# Altium footprint library mfmc_footprints.PcbLib: 156 footprints (part 5 of 10)
Each footprint in its own frame and in the unit in brackets; x right, y up, seen from the top. Pads: shape width x height; smd on the part's side, far side on the other; paste and mask are expansions set on the pad; w line width, h text height; cw(c..) or ccw(c..) is an arc to the next point about the centre after c.
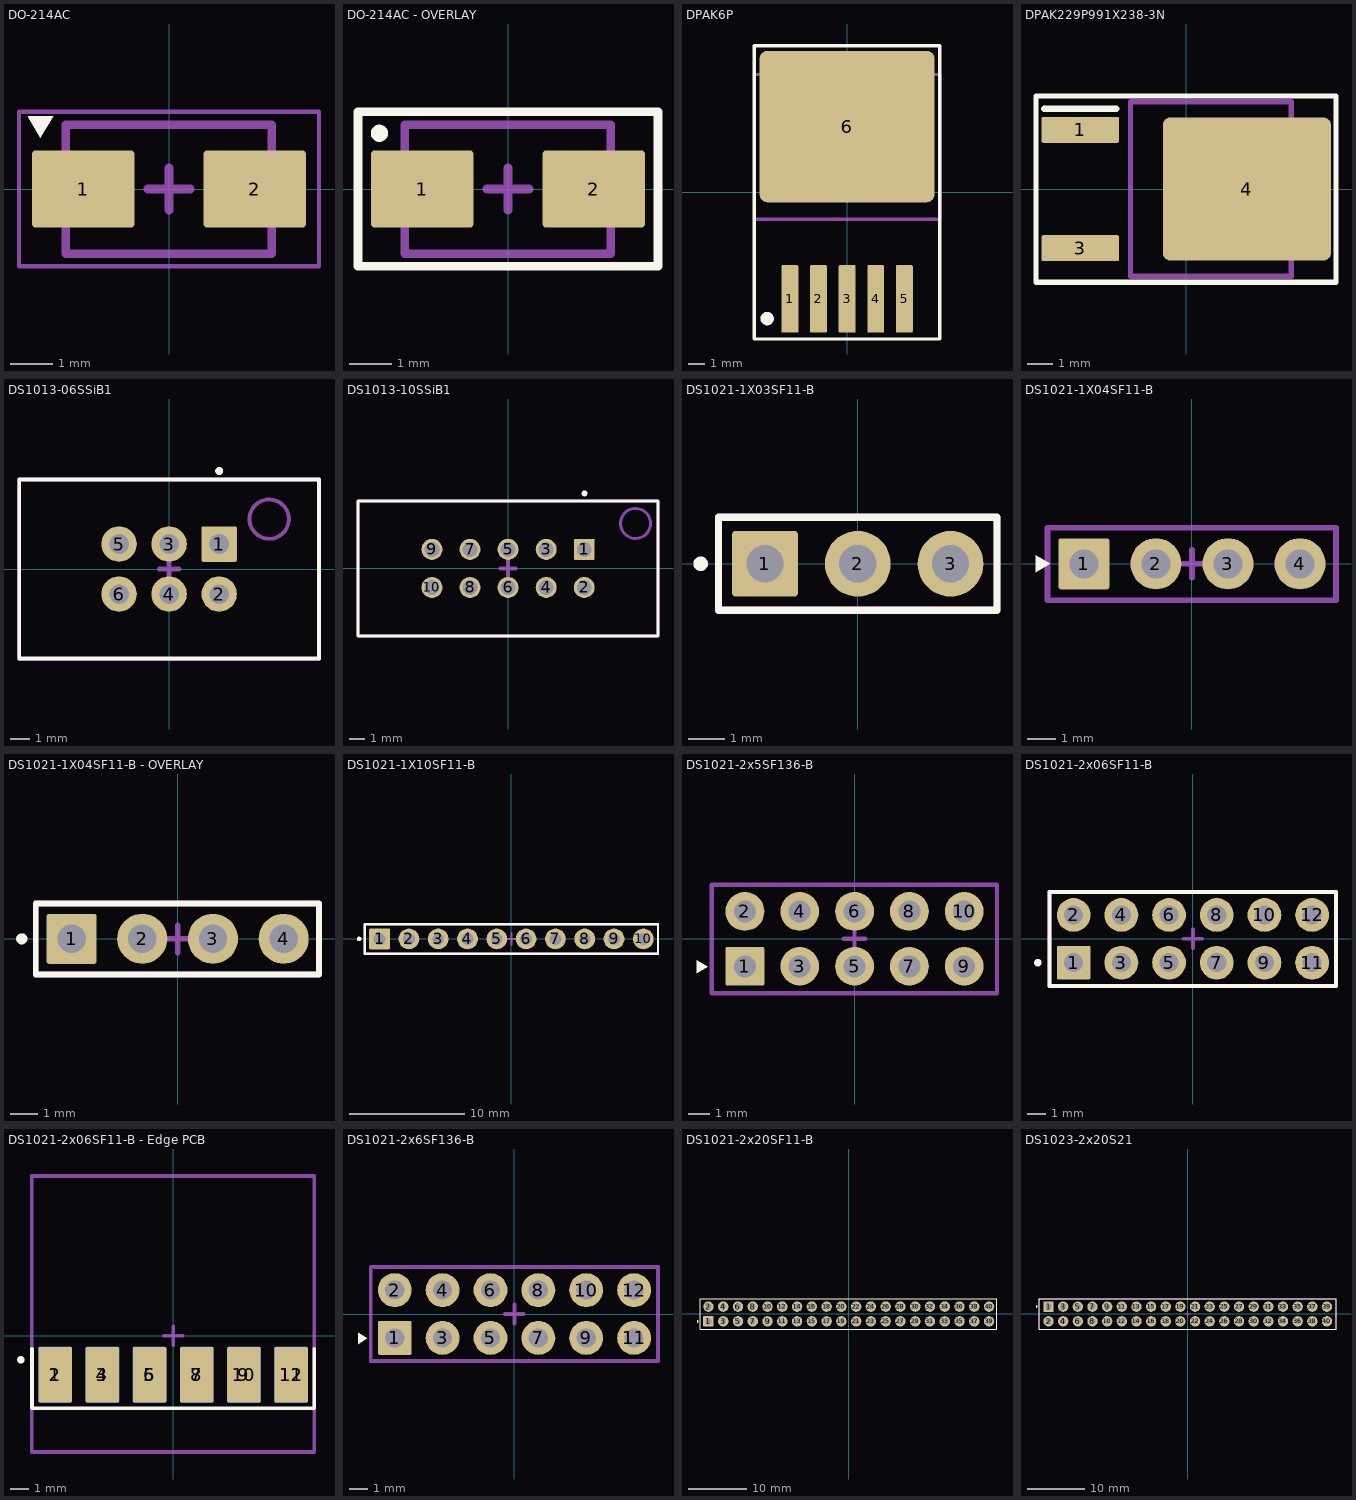
[diagram p4: the footprints below, top view; thin cyan lines are the x and y axes]

## DO-214AC [mm]
height 2.3
pads (2):
  rrect10% 2.4x1.8 smd: 1(-2,0) 2(2,0)
Top Overlay:
  region: -3.3,1.7 -3,1.2 -2.7,1.7
Top Courtyard:
  lines w0.1: -3.5,-1.8 3.5,-1.8 3.5,1.8 -3.5,1.8 -3.5,-1.8
  lines w0.2: -0.5,0 0.5,0 ; 0,-0.5 0,0.5
Top Assembly:
  circle w0.2: c-1.8,0 r0.1
  lines w0.2: -2.413,-1.513 2.4,-1.513 2.4,1.5 -2.413,1.5 -2.413,-1.513
Top Designator (Mech10):
  text ".Designator" at -7.618,-0.508 h1.52
3D body "User Library-DO-214AC SMA.STEP": height 2.42, standoff 0.01, extent -2.6,-1.3 2.6,1.3

## DO-214AC - OVERLAY [mm]
height 2.3
pads (2):
  rrect10% 2.4x1.8 smd: 1(-2,0) 2(2,0)
Top Overlay:
  circle w0.2: c-3,1.3 r0.1
  lines w0.2: -3.5,-1.8 -3.5,1.8 3.5,1.8 3.5,-1.8 -3.5,-1.8
Top Courtyard:
  lines w0.1: -3.5,-1.8 -3.5,1.8 3.5,1.8 3.5,-1.8 -3.5,-1.8
  lines w0.2: -0.5,0 0.5,0 ; 0,-0.5 0,0.5
Top Assembly:
  circle w0.2: c-1.8,0 r0.1
  lines w0.2: -2.413,-1.513 -2.413,1.5 2.4,1.5 2.4,-1.513 -2.413,-1.513
Top Designator (Mech10):
  text ".Designator" at -7.618,-0.508 h1.52
3D body "User Library-DO-214AC SMA.STEP": height 2.42, standoff 0.01, extent -2.6,-1.3 2.6,1.3

## DPAK6P [mm]
height 5
pads (6):
  rrect10% 1x4 smd: 1(-3.4,-6.33) 2(-1.7,-6.33) 3(0,-6.33) 4(1.7,-6.33) 5(3.4,-6.33)
  rrect10% 10.4x9 smd: 6(0,3.91)
Top Overlay:
  circle w0.4: c-4.75,-7.5 r0.2
  lines w0.2: -5.513,-8.713 5.5,-8.713 5.5,8.7 -5.513,8.7 -5.513,-8.713
Top Courtyard:
  lines w0.1: -5.5,-8.7 5.5,-8.7 5.5,8.7 -5.5,8.7 -5.5,-8.7
  lines w0.2: -0.5,0 0.5,0 ; 0,-0.5 0,0.5
Top Assembly:
  lines w0.2: -5.5,-1.6 5.5,-1.6 5.5,7 -5.5,7 -5.5,-1.6
Top Designator (Mech10):
  text ".Designator" at -7.624,-0.514 h1.52
3D body "LM2576-5.0WU.STEP": height 4.83, standoff -0.25, extent -5.08,-7.51 5.08,7.4

## DPAK229P991X238-3N [mm] "D-PAK, 3-Pads, Body 6,21x6,73mm (max), IPC Medium Density"
height 2.38
pads (3):
  rrect10% 3x1 smd: 1(-4.1,2.29) 3(-4.1,-2.29)
  rrect10% 6.5x5.55 smd: 4(2.35,0)
Top Overlay:
  lines w0.2: -5.813,-3.613 5.8,-3.613 5.8,3.6 -5.813,3.6 -5.813,-3.613
  lines w0.254: -5.5,3.1 -2.7,3.1
Top Courtyard:
  lines w0.1: -5.8,-3.6 -5.8,3.6 5.8,3.6 5.8,-3.6 -5.8,-3.6
  lines w0.2: -0.5,0 0.5,0 ; 0,-0.5 0,0.5
Top Assembly:
  lines w0.2: -2.15,-3.375 4.07,-3.375 4.07,3.375 -2.15,3.375 -2.15,-3.375
Top Designator (Mech10):
  text ".Designator" at -7.624,-0.514 h1.52
3D body "DPAK229P991X238-3N.step": height 2.38, standoff 0, extent -4.39,-3.375 5.515,3.375

## DS1013-06SSiB1 [mm] "2.54mm Box Header V/T,R/A & SMT Type"
height 9.1
pads (6):
  rrect10% 1.8x1.8 hole 1: 1(2.54,1.27)
  round 1.8 hole 1: 2(2.54,-1.27) 3(0,1.27) 4(0,-1.27) 5(-2.54,1.27) 6(-2.54,-1.27)
Top Overlay:
  circle w0.2: c2.54,4.98 r0.1
  lines w0.2: -7.61,-4.55 7.61,-4.55 7.61,4.55 -7.61,4.55 -7.61,-4.55
Top Courtyard:
  lines w0.1: -7.61,-4.55 7.61,-4.55 7.61,4.55 -7.61,4.55 -7.61,-4.55
  lines w0.254: -0.5,0 0.5,0 ; 0,-0.5 0,0.5
Top Assembly:
  circle w0.2: c5.08,2.54 r1
  lines w0.2: -7.623,-4.563 7.61,-4.563 7.61,4.55 -7.623,4.55 -7.623,-4.563
Top Designator (Mech10):
  text ".Designator" at -7.624,-0.249 h1.52
3D body "DS1013-06.STEP": height 8.9, standoff -3.1, extent -7.61,-4.5 7.61,4.5

## DS1013-10SSiB1 [mm] "2.54mm Box Header V/T,R/A & SMT Type"
height 9.1
pads (10):
  rrect10% 1.4x1.4 hole 1: 1(5.08,1.27)
  round 1.4 hole 1: 2(5.08,-1.27) 3(2.54,1.27) 4(2.54,-1.27) 5(0,1.27) 6(0,-1.27) 7(-2.54,1.27) 8(-2.54,-1.27) 9(-5.08,1.27) 10(-5.08,-1.27)
Top Overlay:
  circle w0.2: c5.1,5 r0.1
  lines w0.2: -10.013,-4.513 10,-4.513 10,4.5 -10.013,4.5 -10.013,-4.513
Top Courtyard:
  lines w0.1: -10.013,-4.513 10,-4.513 10,4.5 -10.013,4.5 -10.013,-4.513
  lines w0.254: -0.5,0 0.5,0 ; 0,-0.5 0,0.5
Top Assembly:
  circle w0.2: c8.5,3 r1
  lines w0.2: -10.013,-4.513 10,-4.513 10,4.5 -10.013,4.5 -10.013,-4.513
Top Designator (Mech10):
  text ".Designator" at -7.618,-0.214 h1.52
3D body "DS1013.STEP": height 8.9, standoff -3.1, extent -10.15,-4.5 10.15,4.5

## DS1021-1X03SF11-B [mm] "2.54mm Pin Header V/T Type"
height 8.6
pads (3):
  rrect10% 1.8x1.8 hole 1.02: 1(-2.54,0)
  round 1.8 hole 1.02: 2(0,0) 3(2.54,0)
Top Overlay:
  circle w0.2: c-4.3,0 r0.1
  lines w0.2: -3.81,-1.27 3.81,-1.27 3.81,1.27 -3.81,1.27 -3.81,-1.27
Top Courtyard:
  lines w0.1: -3.823,-1.283 3.81,-1.283 3.81,1.27 -3.823,1.27 -3.823,-1.283
  lines w0.2: -0.495,0 0.495,0 ; 0,-0.495 0,0.495
Top Assembly:
  circle w0.2: c-2.54,0 r0.5
  lines w0.2: -3.81,-1.27 3.81,-1.27 3.81,1.27 -3.81,1.27 -3.81,-1.27
Top Designator (Mech10):
  text ".Designator" at -7.913,-0.508 h1.52
3D body "DS1021-1X03.STEP": height 8.6, standoff -3, extent -3.81,-1.27 3.81,1.27

## DS1021-1X04SF11-B [mm] "2.54mm Pin Header V/T Type"
height 8.6
pads (4):
  rrect10% 1.8x1.8 hole 1.02: 1(-3.81,0)
  round 1.8 hole 1.02: 2(-1.27,0) 3(1.27,0) 4(3.81,0)
Top Overlay:
  region: -5,0 -5.5,-0.3 -5.5,0.3
Top Courtyard:
  lines w0.1: -5.093,-1.283 5.08,-1.283 5.08,1.27 -5.093,1.27 -5.093,-1.283
  lines w0.2: -0.495,0 0.495,0 ; 0,-0.495 0,0.495
Top Assembly:
  circle w0.2: c-3.81,0 r0.5
  lines w0.2: -5.093,-1.283 5.08,-1.283 5.08,1.27 -5.093,1.27 -5.093,-1.283
Top Designator (Mech10):
  text ".Designator" at -7.778,-0.514 h1.52
3D body "DS1021-1X04.STEP": height 8.6, standoff -3, extent -5.08,-1.27 5.08,1.27

## DS1021-1X04SF11-B - OVERLAY [mm] "2.54mm Pin Header V/T Type"
height 8.6
pads (4):
  rrect10% 1.8x1.8 hole 1.02: 1(-3.81,0)
  round 1.8 hole 1.02: 2(-1.27,0) 3(1.27,0) 4(3.81,0)
Top Overlay:
  circle w0.2: c-5.6,0 r0.1
  lines w0.2: -5.093,-1.283 5.08,-1.283 5.08,1.27 -5.093,1.27 -5.093,-1.283
Top Courtyard:
  lines w0.1: -5.093,-1.283 5.08,-1.283 5.08,1.27 -5.093,1.27 -5.093,-1.283
  lines w0.2: -0.495,0 0.495,0 ; 0,-0.495 0,0.495
Top Assembly:
  circle w0.2: c-3.81,0 r0.5
  lines w0.2: -5.093,-1.283 5.08,-1.283 5.08,1.27 -5.093,1.27 -5.093,-1.283
Top Designator (Mech10):
  text ".Designator" at -7.928,-0.514 h1.52
3D body "DS1021-1X04.STEP": height 8.6, standoff -3, extent -5.08,-1.27 5.08,1.27

## DS1021-1X10SF11-B [mm] "2.54mm Pin Header V/T Type"
height 8.6
pads (10):
  rrect10% 1.8x1.8 hole 1.02: 1(-11.43,0)
  round 1.8 hole 1.02: 2(-8.89,0) 3(-6.35,0) 4(-3.81,0) 5(-1.27,0) 6(1.27,0) 7(3.81,0) 8(6.35,0) 9(8.89,0) 10(11.43,0)
Top Overlay:
  circle w0.2: c-13.2,0 r0.1
  lines w0.2: -12.713,-1.283 12.7,-1.283 12.7,1.27 -12.713,1.27 -12.713,-1.283
Top Courtyard:
  lines w0.1: -12.713,-1.283 12.7,-1.283 12.7,1.27 -12.713,1.27 -12.713,-1.283
  lines w0.2: -0.495,0 0.495,0 ; 0,-0.495 0,0.495
Top Assembly:
  circle w0.2: c-11.43,0 r0.5
  lines w0.2: -12.713,-1.283 12.7,-1.283 12.7,1.27 -12.713,1.27 -12.713,-1.283
Top Designator (Mech10):
  text ".Designator" at -7.918,-0.514 h1.52
3D body "DS1021-1X10.STEP": height 8.6, standoff -3, extent -12.7,-1.27 12.7,1.27

## DS1021-2x5SF136-B [mm] "2.54 Pin Header V/T Type Double Row"
height 7
pads (10):
  rrect10% 1.8x1.8 hole 1.02: 1(-5.08,-1.27)
  round 1.8 hole 1.02: 2(-5.08,1.27) 3(-2.54,-1.27) 4(-2.54,1.27) 5(0,-1.27) 6(0,1.27) 7(2.54,-1.27) 8(2.54,1.27) 9(5.08,-1.27) 10(5.08,1.27)
Top Overlay:
  region: -6.8,-1.3 -7.3,-1 -7.3,-1.6
Top Courtyard:
  lines w0.1: -6.6,-2.5 6.6,-2.5 6.6,2.5 -6.6,2.5 -6.6,-2.5
  lines w0.2: -0.5,0 0.5,0 ; 0,-0.5 0,0.5
Top Assembly:
  circle w0.2: c-5.08,-1.27 r0.6
  lines w0.2: -6.613,-2.513 6.6,-2.513 6.6,2.5 -6.613,2.5 -6.613,-2.513
Top Designator (Mech10):
  text ".Designator" at -7.918,-0.514 h1.52
3D body "DS1021-Type36.STEP": height 7, standoff -3, extent -6.35,-2.54 6.35,2.54

## DS1021-2x06SF11-B [mm] "2.54mm Pin Header V/T Type Double Rows"
height 8.6
pads (12):
  rrect10% 1.8x1.8 hole 1.02: 1(-6.35,-1.27)
  round 1.8 hole 1.02: 2(-6.35,1.27) 3(-3.81,-1.27) 4(-3.81,1.27) 5(-1.27,-1.27) 6(-1.27,1.27) 7(1.27,-1.27) 8(1.27,1.27) 9(3.81,-1.27) 10(3.81,1.27) 11(6.35,-1.27) 12(6.35,1.27)
Top Overlay:
  circle w0.2: c-8.255,-1.27 r0.1
  lines w0.2: -7.639,-2.519 7.62,-2.519 7.62,2.5 -7.639,2.5 -7.639,-2.519
Top Courtyard:
  lines w0.1: -7.639,-2.519 7.62,-2.519 7.62,2.5 -7.639,2.5 -7.639,-2.519
  lines w0.2: -0.5,0 0.5,0 ; 0,-0.5 0,0.5
Top Assembly:
  circle w0.2: c-6.36,-1.3 r0.5
  lines w0.2: -7.639,-2.519 7.62,-2.519 7.62,2.5 -7.639,2.5 -7.639,-2.519
Top Designator (Mech10):
  text ".Designator" at -7.985,-0.517 h1.52
3D body "DS1021-2X06.STEP": height 8.6, standoff -3, extent -7.62,-2.54 7.62,2.54

## DS1021-2x06SF11-B - Edge PCB [mm] "2.54mm Pin Header V/T Type Double Rows"
height 1.59
pads (12):
  rrect10% 1.8x3 smd: 1(-6.35,-2.1) 3(-3.81,-2.1) 5(-1.27,-2.1) 7(1.27,-2.1) 9(3.81,-2.1) 11(6.35,-2.1)
  rrect10% 1.8x3 smd far side: 2(-6.35,-2.1) 4(-3.81,-2.1) 6(-1.27,-2.1) 8(1.27,-2.1) 10(3.81,-2.1) 12(6.35,-2.1)
Top Overlay:
  circle w0.2: c-8.2,-1.3 r0.1
  lines w0.2: -7.6,-0.7 -7.6,-3.9 7.6,-3.9 7.6,-0.7
Bottom Overlay:
  lines w0.2: -7.6,-0.7 -7.6,-3.9 7.6,-3.9 7.6,-0.7
Top Courtyard:
  lines w0.1: -7.613,-6.263 7.6,-6.263 7.6,8.6 -7.613,8.6 -7.613,-6.263
  lines w0.2: -0.5,0 0.5,0 ; 0,-0.5 0,0.5
Top Assembly:
  circle w0.2: c-6.35,-2.1 r0.5
  lines w0.2: -7.613,-6.263 7.6,-6.263 7.6,8.6 -7.613,8.6 -7.613,-6.263
Top Designator (Mech10):
  text ".Designator" at -7.968,0.661 h1.52
3D body "DS1021-2X06.STEP": height 1.6, standoff -3.48, extent -7.62,-3 7.62,8.6

## DS1021-2x6SF136-B [mm] "2.54 Pin Header V/T Type Double Row"
height 7
pads (12):
  rrect10% 1.8x1.8 hole 1.02: 1(-6.35,-1.27)
  round 1.8 hole 1.02: 2(-6.35,1.27) 3(-3.81,-1.27) 4(-3.81,1.27) 5(-1.27,-1.27) 6(-1.27,1.27) 7(1.27,-1.27) 8(1.27,1.27) 9(3.81,-1.27) 10(3.81,1.27) 11(6.35,-1.27) 12(6.35,1.27)
Top Overlay:
  region: -7.8,-1.3 -8.3,-1 -8.3,-1.6
Top Courtyard:
  lines w0.1: -7.62,-2.5 7.62,-2.5 7.62,2.5 -7.62,2.5 -7.62,-2.5
  lines w0.2: -0.5,0 0.5,0 ; 0,-0.5 0,0.5
Top Assembly:
  circle w0.2: c-6.35,-1.27 r0.5
  lines w0.2: -7.62,-2.5 7.62,-2.5 7.62,2.5 -7.62,2.5 -7.62,-2.5
Top Designator (Mech10):
  text ".Designator" at -7.908,-0.508 h1.52
3D body "DS1021-2x06-Type36.STEP": height 7, standoff -3, extent -7.62,-2.54 7.62,2.54

## DS1021-2x20SF11-B [mm]
height 6.1
pads (40):
  rrect10% 1.8x1.8 hole 1.02: 1(-24.13,-1.27)
  round 1.8 hole 1.02: 2(-24.13,1.27) 3(-21.59,-1.27) 4(-21.59,1.27) 5(-19.05,-1.27) 6(-19.05,1.27) 7(-16.51,-1.27) 8(-16.51,1.27) 9(-13.97,-1.27) 10(-13.97,1.27) 11(-11.43,-1.27) 12(-11.43,1.27) 13(-8.89,-1.27) 14(-8.89,1.27) 15(-6.35,-1.27) 16(-6.35,1.27) 17(-3.81,-1.27) 18(-3.81,1.27) 19(-1.27,-1.27) 20(-1.27,1.27) 21(1.27,-1.27) 22(1.27,1.27) 23(3.81,-1.27) 24(3.81,1.27) 25(6.35,-1.27) 26(6.35,1.27) 27(8.89,-1.27) 28(8.89,1.27) 29(11.43,-1.27) 30(11.43,1.27) 31(13.97,-1.27) 32(13.97,1.27) 33(16.51,-1.27) 34(16.51,1.27) 35(19.05,-1.27) 36(19.05,1.27) 37(21.59,-1.27) 38(21.59,1.27) 39(24.13,-1.27) 40(24.13,1.27)
Top Overlay:
  circle w0.2: c-26,-1.3 r0.1
  lines w0.2: -25.513,-2.613 25.5,-2.613 25.5,2.6 -25.513,2.6 -25.513,-2.613
Top Designator (Mech10):
  text ".Designator" at -7.918,-0.514 h1.52

## DS1023-2x20S21 [mm]
height 8.5
pads (40):
  rrect10% 1.8x1.8 hole 1.02: 1(-24.13,1.27)
  round 1.8 hole 1.02: 2(-24.13,-1.27) 3(-21.59,1.27) 4(-21.59,-1.27) 5(-19.05,1.27) 6(-19.05,-1.27) 7(-16.51,1.27) 8(-16.51,-1.27) 9(-13.97,1.27) 10(-13.97,-1.27) 11(-11.43,1.27) 12(-11.43,-1.27) 13(-8.89,1.27) 14(-8.89,-1.27) 15(-6.35,1.27) 16(-6.35,-1.27) 17(-3.81,1.27) 18(-3.81,-1.27) 19(-1.27,1.27) 20(-1.27,-1.27) 21(1.27,1.27) 22(1.27,-1.27) 23(3.81,1.27) 24(3.81,-1.27) 25(6.35,1.27) 26(6.35,-1.27) 27(8.89,1.27) 28(8.89,-1.27) 29(11.43,1.27) 30(11.43,-1.27) 31(13.97,1.27) 32(13.97,-1.27) 33(16.51,1.27) 34(16.51,-1.27) 35(19.05,1.27) 36(19.05,-1.27) 37(21.59,1.27) 38(21.59,-1.27) 39(24.13,1.27) 40(24.13,-1.27)
Top Overlay:
  circle w0.2: c-26.2,1.3 r0.1
  lines w0.2: -25.713,-2.613 25.7,-2.613 25.7,2.6 -25.713,2.6 -25.713,-2.613
Top Courtyard:
  lines w0.1: -25.713,-2.613 25.7,-2.613 25.7,2.6 -25.713,2.6 -25.713,-2.613
  lines w0.2: -0.5,0 0.5,0 ; 0,-0.5 0,0.5
Top Assembly:
  circle w0.2: c-24.13,1.27 r0.5
  lines w0.2: -25.713,-2.613 25.7,-2.613 25.7,2.6 -25.713,2.6 -25.713,-2.613
Top Designator (Mech10):
  text ".Designator" at -7.918,-0.514 h1.52
3D body "User Library-PBD_(DS1023-2)_2line_connectors_h=5_0_8_5mm_step_2_54mm.STEP": height 8.5, standoff -3, extent -25.65,-2.58 25.65,2.42